# Altium footprint library MyPcbLib.PcbLib: 88 footprints (part 2 of 6)
Each footprint in its own frame and in the unit in brackets; x right, y up, seen from the top. Pads: shape width x height; smd on the part's side, far side on the other; paste and mask are expansions set on the pad; w line width, h text height; cw(c..) or ccw(c..) is an arc to the next point about the centre after c.
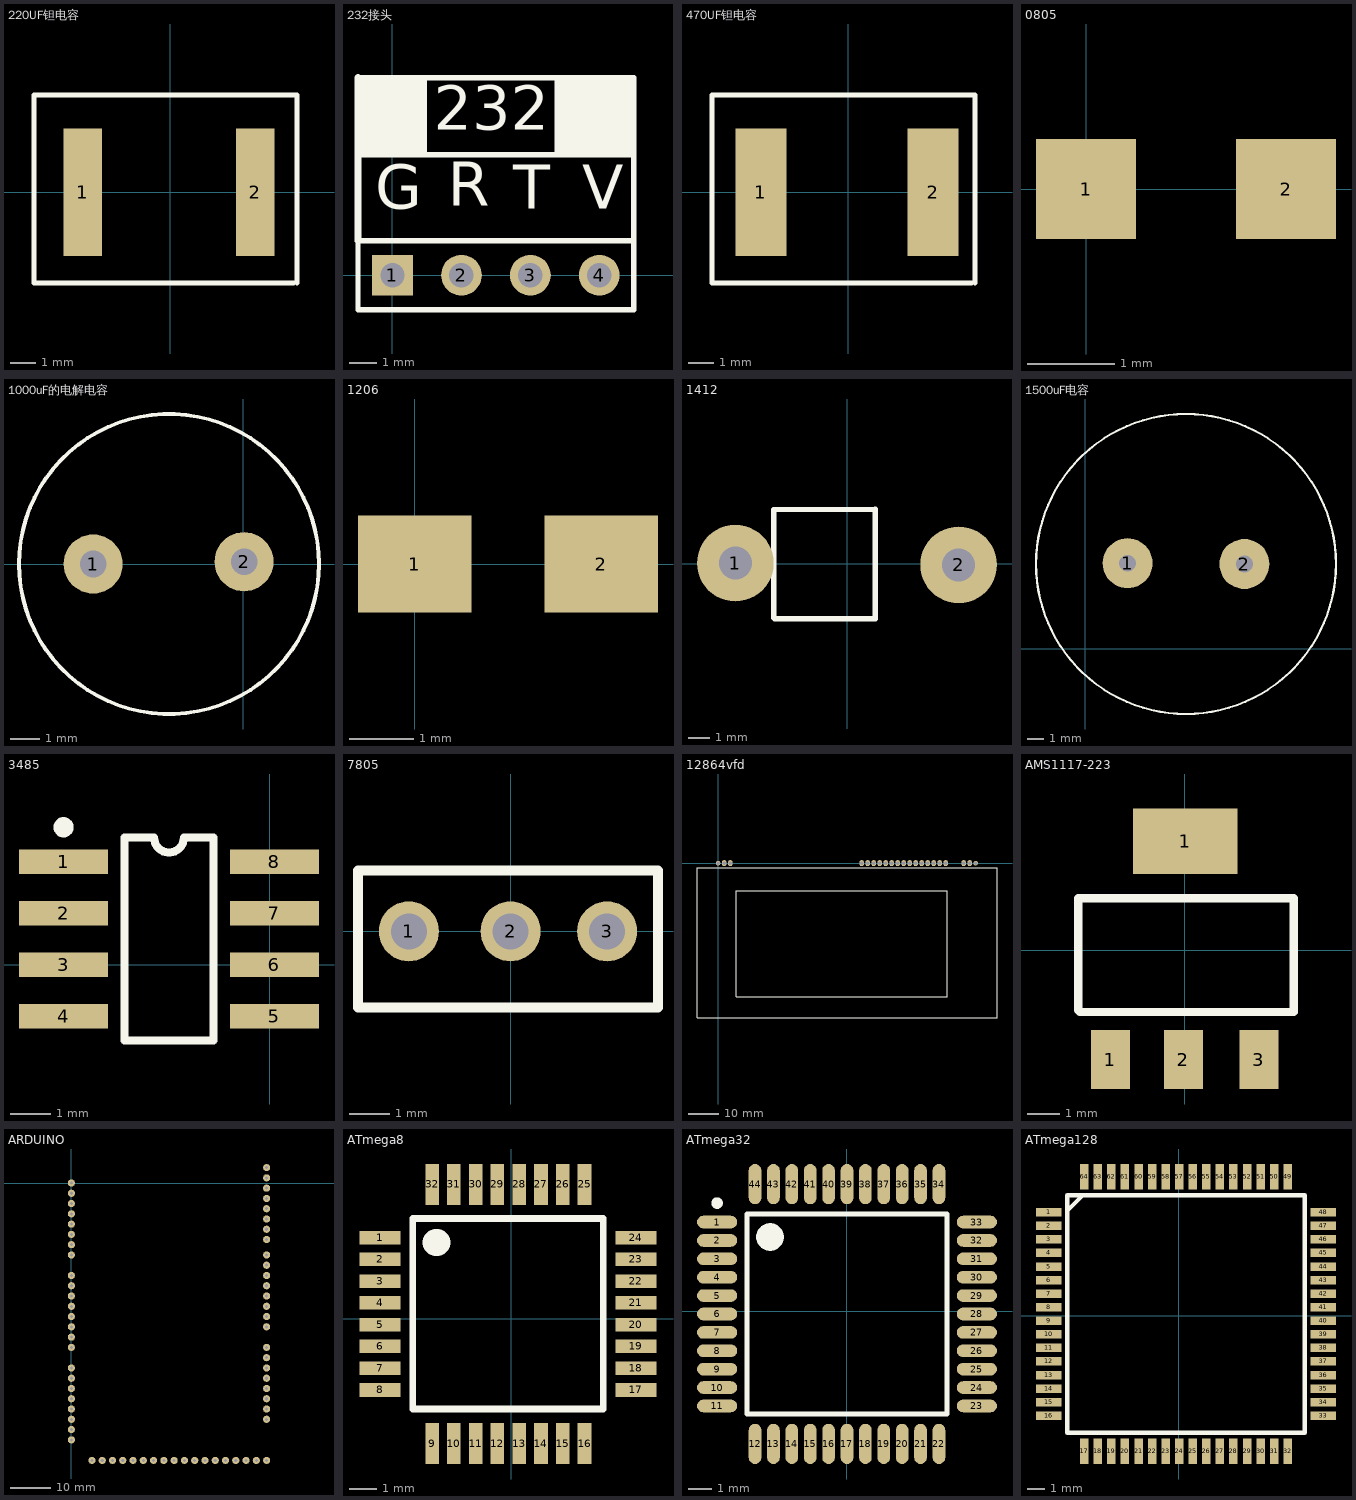
[diagram p1: the footprints below, top view; thin cyan lines are the x and y axes]

## 220UF钽电容 [mm]
pads (2):
  rect 1.5x5 smd: 1(-3.429,0) 2(3.321,0)
Top Overlay:
  lines w0.2: 4.826,-3.556 -5.334,-3.556 -5.334,3.81 -5.08,3.81 4.953,3.81 4.953,-3.556

## 232接头 [mm] "Connector; Header; 4 Position"
height 2.54
pads (4):
  rect 1.5x1.5 hole 0.9: 1(0,0)
  round 1.5 hole 0.9: 2(2.54,0) 3(5.08,0) 4(7.62,0)
Top Overlay:
  rectangle: 5.976,4.445 8.89,7.281
  rectangle: -1.27,4.445 1.27,7.281
  lines w0.2: -1.27,-1.27 -1.27,1.27 8.89,1.27 8.89,-1.27 -1.27,-1.27
  lines w0.203: -1.27,4.445 8.89,4.445 ; -1.27,7.281 8.89,7.281 8.89,1.27
  lines w0.254: -1.27,1.27 -1.27,7.281
  text "V" at 6.985,1.905 h2.79
  text "T" at 4.445,1.905 h2.79
  text "R" at 2.032,2.032 h2.79
  text "G" at -0.635,1.905 h2.79
  text "232" at 1.524,4.826 h2.79

## 470UF钽电容 [mm]
pads (2):
  rect 2x5 smd: 1(-3.429,0) 2(3.321,0)
Top Overlay:
  lines w0.2: 4.826,-3.556 -5.334,-3.556 -5.334,3.81 -5.08,3.81 4.953,3.81 4.953,-3.556

## 0805 [mil]
pads (2):
  rect 45x45 smd: 1(0,0) 2(90,0)

## 1000uF的电解电容 [mm]
pads (2):
  round 2 hole 0.9: 1(-5.08,0) 2(0.025,0.076)
Top Overlay:
  circle w0.127: c-2.515,0 r5.075

## 1206 [mil]
pads (2):
  rect 70x60 smd: 1(0,0) 2(115,0)

## 1412 [mm]
pads (2):
  round 3.5 hole 1.5: 1(-5.105,0.025) 2(5.08,-0.051)
Top Overlay:
  lines w0.254: -3.353,-2.464 -3.353,-0.025 ; -3.353,-0.229 -3.353,2.464 1.27,2.489 1.27,-2.464 ; -3.302,-2.515 1.27,-2.515
Multi-Layer:
  lines w0.254: -3.378,2.489 -3.353,2.464

## 1500uF电容 [mm]
pads (2):
  round 3 hole 1: 1(2.54,5.131) 2(9.55,5.08)
Top Overlay:
  circle w0.127: c6.045,5.08 r9

## 3485 [mm]
pads (8):
  rect 2.2x0.6 smd: 1(-5.08,2.54) 2(-5.08,1.27) 3(-5.08,0) 4(-5.08,-1.27) 5(0.12,-1.27) 6(0.12,0) 7(0.12,1.27) 8(0.12,2.54)
Top Overlay:
  circle w0.25: c-5.08,3.39 r0.125
  lines w0.2: -3.58,-1.865 -3.58,3.135 -2.847,3.135 ccw(c-2.48,3.135) -2.113,3.135 -1.38,3.135 -1.38,-1.865 -3.58,-1.865

## 7805 [mm]
pads (3):
  round 1.5 hole 0.9: 1(-2.54,0) 2(0,0) 3(2.413,0)
Top Overlay:
  lines w0.254: -3.81,-1.905 3.683,-1.905 3.683,1.524 -3.81,1.524 -3.81,-1.905

## 12864vfd [mil]
pads (21):
  round 60 hole 45: 1(0,0) 21(3380,0)
  oval 60x80 hole 45: 2(80,0) 3(160,0) 4(1883.94,0) 5(1962.68,0) 6(2041.42,0) 7(2120.16,0) 8(2198.9,0) 9(2277.64,0) 10(2356.38,0) 11(2435.12,0) 12(2513.86,0) 13(2592.6,0) 14(2671.34,0) 15(2750.08,0) 16(2828.82,0) 17(2907.56,0) 18(2986.3,0) 19(3222.52,0) 20(3301.26,0)
Top Overlay:
  lines w10: -277.01,-2030 -277.01,-60 3660,-60 3660,-2030 -277.01,-2030 ; 240,-1750 3005,-1750 3005,-365 240,-365 240,-1750

## AMS1117-223 [mil]
pads (4):
  rect 47.24x70.87 smd: 1(-89.5,-131.5) 2(-1.5,-131.5) 3(89.5,-131.5)
  rect 125.98x78.74 smd: 1(0.5,131.5)
Top Overlay:
  lines w10: -128.3,-72.15 -128.3,62.7 131.54,62.7 131.54,-74.11 -126.33,-74.11

## ARDUINO [mil]
pads (66):
  round 70 hole 30: 1(0,0) 2(0,-100) 3(0,-200) 4(0,-300) 5(0,-400) 6(0,-500) 7(0,-600) 8(0,-700) 9(0,-900) 10(0,-1000) 11(0,-1100) 12(0,-1200) 13(0,-1300) 14(0,-1400) 15(0,-1500) 16(0,-1600) 17(0,-1800) 18(0,-1900) 19(0,-2000) 20(0,-2100) 21(0,-2200) 22(0,-2300) 23(0,-2400) 24(0,-2500) 25(200,-2700) 26(300,-2700) 27(400,-2700) 28(500,-2700) 29(600,-2700) 30(700,-2700) 31(800,-2700) 32(900,-2700) 33(1000,-2700) 34(1100,-2700) 35(1200,-2700) 36(1300,-2700) 37(1400,-2700) 38(1500,-2700) 39(1600,-2700) 40(1700,-2700) 41(1800,-2700) 42(1900,-2700) 43(1900,-2300) 44(1900,-2200) 45(1900,-2100) 46(1900,-2000) 47(1900,-1900) 48(1900,-1800) 49(1900,-1700) 50(1900,-1600) 51(1900,-1400) 52(1900,-1300) 53(1900,-1200) 54(1900,-1100) 55(1900,-1000) 56(1900,-900) 57(1900,-800) 58(1900,-700) 59(1900,-550) 60(1900,-450) 61(1900,-350) 62(1900,-250) 63(1900,-150) 64(1900,-50) 65(1900,50) 66(1900,150)

## ATmega8 [mm]
pads (32):
  rect 1.5x0.5 smd: 1(-4.824,2.982) 2(-4.824,2.182) 3(-4.824,1.382) 4(-4.824,0.582) 5(-4.824,-0.218) 6(-4.824,-1.018) 7(-4.824,-1.818) 8(-4.824,-2.618) 17(4.576,-2.618) 18(4.576,-1.818) 19(4.576,-1.018) 20(4.576,-0.218) 21(4.576,0.582) 22(4.576,1.382) 23(4.576,2.182) 24(4.576,2.982)
  rect 0.5x1.5 smd: 9(-2.913,-4.588) 10(-2.113,-4.588) 11(-1.313,-4.588) 12(-0.513,-4.588) 13(0.287,-4.588) 14(1.087,-4.588) 15(1.887,-4.588) 16(2.687,-4.588) 25(2.687,4.936) 26(1.887,4.936) 27(1.087,4.936) 28(0.287,4.936) 29(-0.513,4.936) 30(-1.313,4.936) 31(-2.113,4.936) 32(-2.913,4.936)
Top Overlay:
  lines w0.254: -3.624,-3.318 -3.624,3.682 3.376,3.682 3.376,-3.318 -3.624,-3.318
  lines w1: -2.76,2.803 -2.735,2.803

## ATmega32 [mm]
pads (44):
  oval 1.75x0.55 smd: 1(-5.65,3.873) 2(-5.65,3.073) 3(-5.65,2.273) 4(-5.65,1.473) 5(-5.65,0.673) 6(-5.65,-0.127) 7(-5.65,-0.927) 8(-5.65,-1.727) 9(-5.65,-2.527) 10(-5.65,-3.327) 11(-5.65,-4.127) 23(5.65,-4.127) 24(5.65,-3.327) 25(5.65,-2.527) 26(5.65,-1.727) 27(5.65,-0.927) 28(5.65,-0.127) 29(5.65,0.673) 30(5.65,1.473) 31(5.65,2.273) 32(5.65,3.073) 33(5.65,3.873)
  oval 0.55x1.75 smd: 12(-4,-5.777) 13(-3.2,-5.777) 14(-2.4,-5.777) 15(-1.6,-5.777) 16(-0.8,-5.777) 17(0,-5.777) 18(0.8,-5.777) 19(1.6,-5.777) 20(2.4,-5.777) 21(3.2,-5.777) 22(4,-5.777) 34(4,5.523) 35(3.2,5.523) 36(2.4,5.523) 37(1.6,5.523) 38(0.8,5.523) 39(0,5.523) 40(-0.8,5.523) 41(-1.6,5.523) 42(-2.4,5.523) 43(-3.2,5.523) 44(-4,5.523)
Top Overlay:
  circle w0.6: c-3.35,3.223 r0.3
  circle w0.25: c-5.65,4.698 r0.125
  lines w0.2: -4.35,-4.477 4.35,-4.477 4.35,4.223 -4.35,4.223 -4.35,-4.477

## ATmega128 [mm]
pads (64):
  rect 1.5x0.5 smd: 1(-7.66,6.112) 2(-7.66,5.312) 3(-7.66,4.512) 4(-7.66,3.712) 5(-7.66,2.912) 6(-7.66,2.112) 7(-7.66,1.312) 8(-7.66,0.512) 9(-7.66,-0.288) 10(-7.66,-1.088) 11(-7.66,-1.888) 12(-7.66,-2.688) 13(-7.66,-3.488) 14(-7.66,-4.288) 15(-7.66,-5.088) 16(-7.66,-5.888) 33(8.54,-5.888) 34(8.54,-5.088) 35(8.54,-4.288) 36(8.54,-3.488) 37(8.54,-2.688) 38(8.54,-1.888) 39(8.54,-1.088) 40(8.54,-0.288) 41(8.54,0.512) 42(8.54,1.312) 43(8.54,2.112) 44(8.54,2.912) 45(8.54,3.712) 46(8.54,4.512) 47(8.54,5.312) 48(8.54,6.112)
  rect 0.5x1.5 smd: 17(-5.56,-7.988) 18(-4.76,-7.988) 19(-3.96,-7.988) 20(-3.16,-7.988) 21(-2.36,-7.988) 22(-1.56,-7.988) 23(-0.76,-7.988) 24(0.04,-7.988) 25(0.84,-7.988) 26(1.64,-7.988) 27(2.44,-7.988) 28(3.24,-7.988) 29(4.04,-7.988) 30(4.84,-7.988) 31(5.64,-7.988) 32(6.44,-7.988) 49(6.44,8.212) 50(5.64,8.212) 51(4.84,8.212) 52(4.04,8.212) 53(3.24,8.212) 54(2.44,8.212) 55(1.64,8.212) 56(0.84,8.212) 57(0.04,8.212) 58(-0.76,8.212) 59(-1.56,8.212) 60(-2.36,8.212) 61(-3.16,8.212) 62(-3.96,8.212) 63(-4.76,8.212) 64(-5.56,8.212)
Top Overlay:
  lines w0.254: -6.56,6.212 -5.76,7.012 ; -6.56,-6.888 7.44,-6.888 7.44,7.112 -6.56,7.112 -6.56,-6.888